# Altium footprint library 00.PcbLib: 150 footprints (part 3 of 10)
Each footprint in its own frame and in the unit in brackets; x right, y up, seen from the top. Pads: shape width x height; smd on the part's side, far side on the other; paste and mask are expansions set on the pad; w line width, h text height; cw(c..) or ccw(c..) is an arc to the next point about the centre after c.
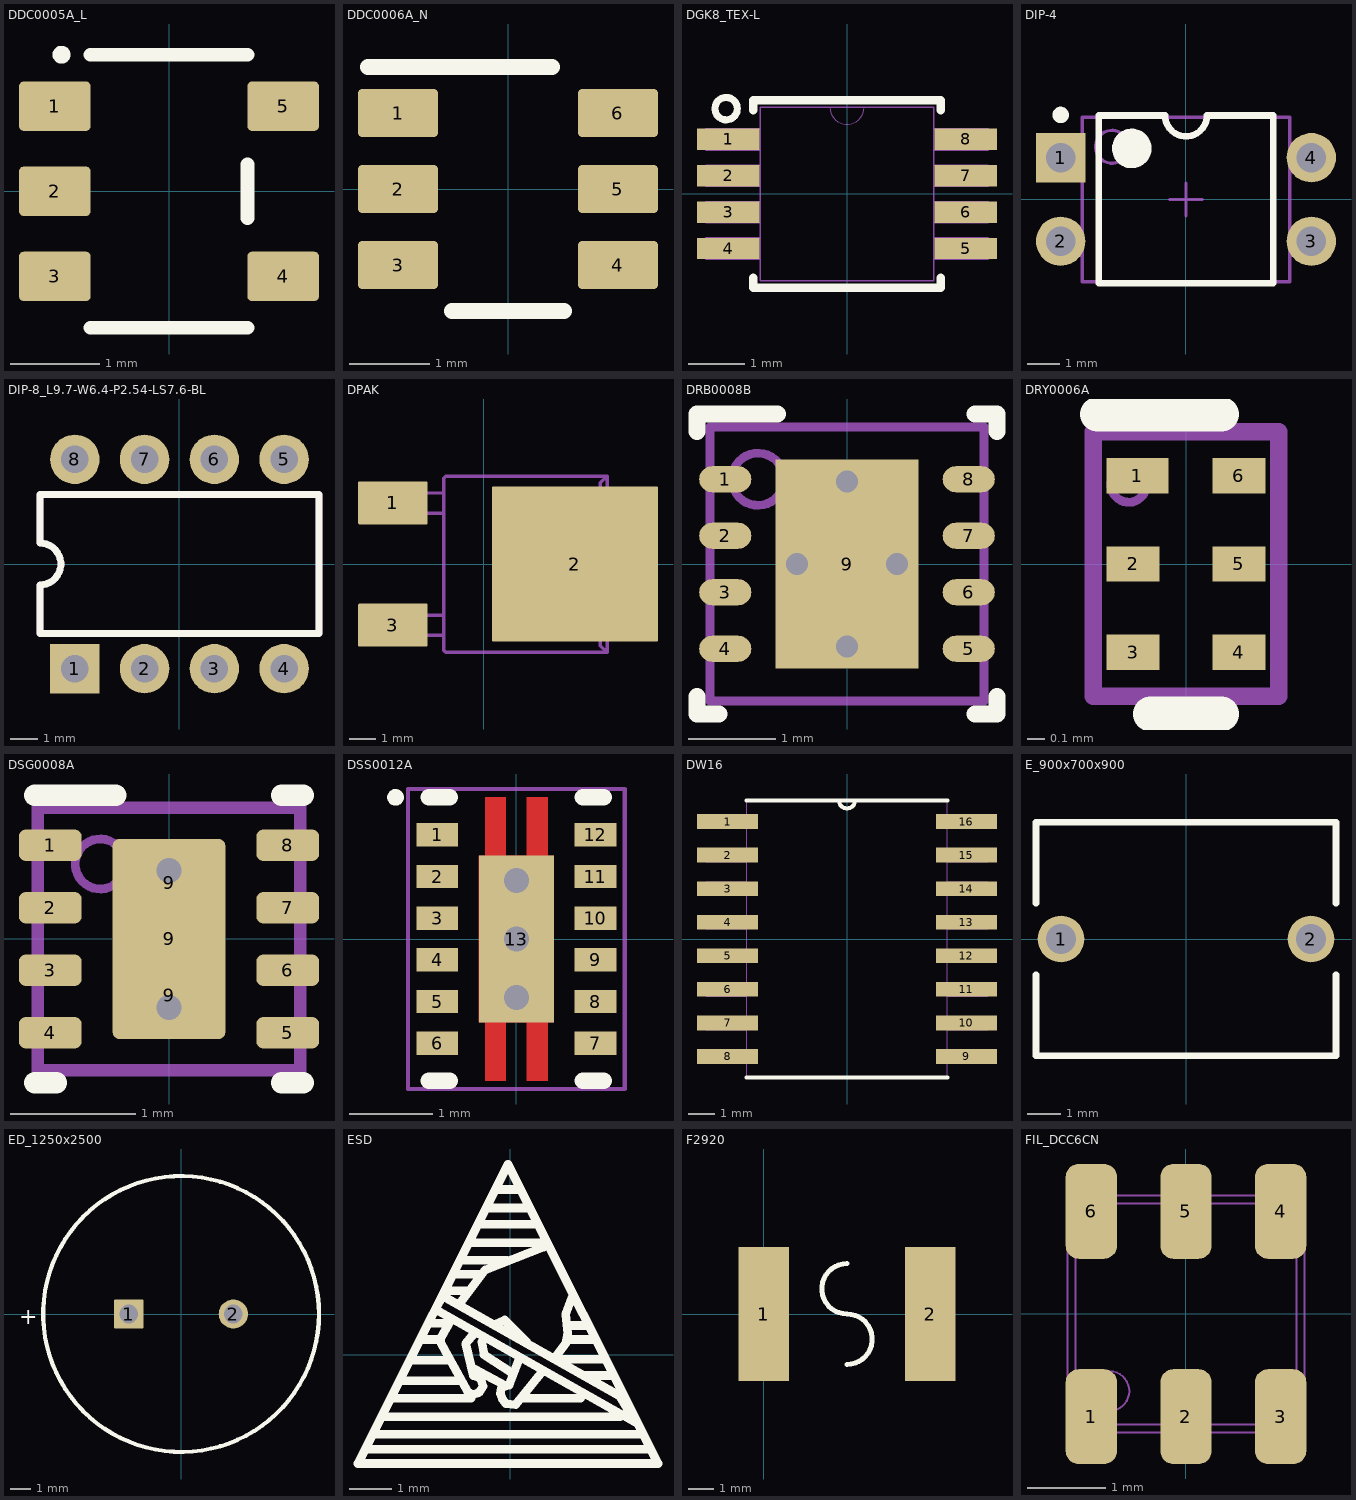
[diagram p2: the footprints below, top view; thin cyan lines are the x and y axes]

## DDC0005A_L [mm]
pads (5):
  rrect18% 0.8x0.55 smd: 1(-1.275,0.95) 2(-1.275,0) 3(-1.275,-0.95) 4(1.275,-0.95) 5(1.275,0.95)
Top Overlay:
  circle w0.1: c-1.2,1.525 r0.05
  lines w0.152: -0.876,-1.524 0.876,-1.524 ; -0.876,1.524 0.876,1.524 ; 0.876,-0.299 0.876,0.299
3D body "DDC0005A.stp": height 1.1, standoff 0, extent -1.405,-1.45 1.406,1.45

## DDC0006A_N [mm]
pads (6):
  rrect17% 1x0.6 smd: 1(-1.375,0.95) 2(-1.375,0) 3(-1.375,-0.95) 4(1.375,-0.95) 5(1.375,0) 6(1.375,0.95)
Top Overlay:
  lines w0.2: -1.75,1.525 0.55,1.525 ; -0.7,-1.524 0.7,-1.524
3D body "DDC0006A.stp": height 0.92, standoff 0, extent -1.434,-1.485 1.434,1.485

## DGK8_TEX-L [mil]
pads (8):
  rect 44x15 smd paste+0 mask+0: 1(-83.5,38.39) 2(-83.5,12.8) 3(-83.5,-12.8) 4(-83.5,-38.39) 5(83.5,-38.39) 6(83.5,-12.8) 7(83.5,12.8) 8(83.5,38.39)
Top Overlay:
  circle w5: c-85,60 r7.87
  lines w6: -66,-58.99 -66,-66 66,-66 66,-58.99 ; -66,58.99 -66,66 66,66 66,58.99
Top Component Outline (Mech100):
  lines w0: -12,61 ccw(c0,61) 12,61
  lines w1: -99.5,-45.89 -61,-45.89 -61,-30.89 -99.5,-30.89 -99.5,-45.89 ; -99.5,-20.3 -61,-20.3 -61,-5.3 -99.5,-5.3 -99.5,-20.3 ; -99.5,5.3 -61,5.3 -61,20.3 -99.5,20.3 -99.5,5.3 ; -99.5,30.89 -61,30.89 -61,45.89 -99.5,45.89 -99.5,30.89 ; -61,-61 61,-61 61,61 -61,61 -61,-61 ; 61,-45.89 99.5,-45.89 99.5,-30.89 61,-30.89 61,-45.89 ; 61,-20.3 99.5,-20.3 99.5,-5.3 61,-5.3 61,-20.3 ; 61,5.3 99.5,5.3 99.5,20.3 61,20.3 61,5.3 ; 61,30.89 99.5,30.89 99.5,45.89 61,45.89 61,30.89
3D body "DGK0008A.stp": height 43.31, standoff 0, extent -96.49,-58.99 96.5,59

## DIP-4 [mm] "DIP; 4 Leads; Row Spacing 7.62 mm; Pitch 2.54 mm"
height 5.6
pads (4):
  rect 1.5x1.5 hole 0.9: 1(-3.81,1.27)
  round 1.5 hole 0.9: 2(-3.81,-1.27) 3(3.81,-1.27) 4(3.81,1.27)
Top Overlay:
  circle w0.25: c-3.81,2.57 r0.125
  circle w0.6: c-1.65,1.55 r0.3
  lines w0.2: -0.635,2.55 ccw(c0,2.55) 0.635,2.55
  lines w0.203: -0.635,2.55 -2.65,2.55 -2.65,-2.55 2.65,-2.55 2.65,2.55 0.635,2.55
Top 3D Body:
  circle w0.1: c-2.25,1.6 r0.5
  lines w0.1: -3.15,-2.5 -3.15,2.5 3.15,2.5 3.15,-2.5 -3.15,-2.5
Mechanical 15:
  lines w0.1: -0.5,0 0.5,0 ; 0,-0.5 0,0.5
3D body: height 5.6, standoff 0, extent -3.15,-2.5 3.15,2.5

## DIP-8_L9.7-W6.4-P2.54-LS7.6-BL [mm]
pads (8):
  rect 1.8x1.8 hole 1: 1(-3.81,-3.81)
  round 1.8 hole 1: 2(-1.27,-3.81) 3(1.27,-3.81) 4(3.81,-3.81) 5(3.81,3.81) 6(1.27,3.81) 7(-1.27,3.81) 8(-3.81,3.81)
Top Overlay:
  lines w0.254: -5.08,-2.531 5.08,-2.531 5.08,2.534 -5.08,2.534 -5.08,0.762 cw(c-5.08,0) -5.08,-0.762 -5.08,-2.531
Top Component Outline (Mech100):
  lines w0.254: -5.08,-2.531 -5.08,-0.762 ccw(c-5.08,0) -5.08,0.762 -5.08,2.534 5.08,2.534 5.08,-2.531 -5.08,-2.531
3D body: height 4.5, standoff 0.5, extent -5.08,-2.54 5.08,2.54

## DPAK [mm]
pads (3):
  rrect6% 2.6x1.6 smd: 1(-3.4,2.28) 3(-3.4,-2.28)
  rrect2% 6.2x5.8 smd paste-3: 2(3.4,0)
Top Paste:
  rectangle: 0.4,-2.8 1.675,-1.625
  rectangle: 1.975,-2.8 3.25,-1.625
  rectangle: 3.55,-2.8 4.825,-1.625
  rectangle: 5.125,-2.8 6.4,-1.625
  rectangle: 5.125,-1.325 6.4,-0.15
  rectangle: 3.55,-1.325 4.825,-0.15
  rectangle: 1.975,-1.325 3.25,-0.15
  rectangle: 0.4,-1.325 1.675,-0.15
  rectangle: 5.125,0.15 6.4,1.325
  rectangle: 3.55,0.15 4.825,1.325
  rectangle: 1.975,0.15 3.25,1.325
  rectangle: 0.4,0.15 1.675,1.325
  rectangle: 5.125,1.625 6.4,2.8
  rectangle: 3.55,1.625 4.825,2.8
  rectangle: 1.975,1.625 3.25,2.8
  rectangle: 0.4,1.625 1.675,2.8
Top Component Outline (Mech100):
  lines w0.127: -1.5,-2.665 -3.899,-2.665 -3.899,-1.915 -1.5,-1.915 ; -1.5,1.9 -3.899,1.9 -3.899,2.65 -1.5,2.65 ; 4.6,-3.3 4.348,-3.048 4.348,3.028 4.6,3.28 ; 4.6,-3.3 4.6,-2.69 5.8,-2.69 5.8,-2.01 5.308,-2.01 5.308,1.99 5.8,1.99 5.8,2.67 4.6,2.67 4.6,3.28 ; 4.6,-3.3 -1.429,-3.3 -1.5,-3.229 -1.5,-3.157 -1.5,3.137 -1.5,3.209 -1.429,3.28 4.6,3.28
3D body "td03b.stp": height 2.48, standoff 0.01, extent -3.856,-3.29 5.843,3.29

## DRB0008B [mm]
pads (9):
  oval 0.6x0.3 smd paste+0 mask+0.051: 1(-1.4,0.975) 2(-1.4,0.325) 3(-1.4,-0.325) 4(-1.4,-0.975) 5(1.4,-0.975) 6(1.4,-0.325) 7(1.4,0.325) 8(1.4,0.975)
  rect 1.65x2.4 smd paste-1.187 mask+0.051: 9(0,0)
via 0.575,0 diameter 0.5 hole 0.254
via -0.575,0 diameter 0.5 hole 0.254
via 0,0.95 diameter 0.5 hole 0.254
via 0,-0.95 diameter 0.5 hole 0.254
Top Overlay:
  lines w0.2: -1.725,-1.525 -1.725,-1.725 -1.475,-1.725 ; -1.725,1.525 -1.725,1.725 -0.8,1.725 ; 1.475,-1.725 1.725,-1.725 1.725,-1.525 ; 1.475,1.725 1.725,1.725 1.725,1.525
Top Paste:
  region: -0.751,1.143 -0.751,0.1 0.752,0.1 0.752,1.143
  region: -0.751,-0.1 -0.751,-1.143 0.752,-1.143 0.752,-0.1
Top Component Outline (Mech100):
  circle w0.1: c-1.025,0.975 r0.3
  lines w0.1: -1.575,-1.575 1.575,-1.575 1.575,1.575 -1.575,1.575 -1.575,-1.575
3D body: height 0.25, standoff 0, extent -1.575,-1.575 1.575,1.575

## DRY0006A [mm]
pads (6):
  rect 0.35x0.2 smd: 1(-0.275,0.5)
  rect 0.3x0.2 smd: 2(-0.3,0) 3(-0.3,-0.5) 4(0.3,-0.5) 5(0.3,0) 6(0.3,0.5)
Top Overlay:
  lines w0.2: -0.5,0.85 0.2,0.85 ; -0.2,-0.85 0.2,-0.85
Top Courtyard:
  circle w0.05: c-0.325,0.45 r0.1
  lines w0.1: -0.525,-0.75 -0.525,0.75 0.525,0.75 0.525,-0.75 -0.525,-0.75
3D body: height 0.61, standoff 0.3, extent -0.424,0.351 -0.226,0.549
3D body: height 0.6, standoff 0, extent -0.525,-0.75 0.525,0.75

## DSG0008A [mm]
pads (11):
  rrect40% 0.5x0.25 smd: 1(-0.95,0.75) 2(-0.95,0.25) 3(-0.95,-0.25) 4(-0.95,-0.75) 5(0.95,-0.75) 6(0.95,-0.25) 7(0.95,0.25) 8(0.95,0.75)
  rrect50% 0.9x0.7 on Top Paste: 9(0,-0.45) 9(0,0.45)
  rrect11% 0.9x1.6 smd paste-0.45: 9(0,0)
via 0,0.55 diameter 0.5 hole 0.2
via 0,-0.55 diameter 0.5 hole 0.2
Top Overlay:
  lines w0.17: -1.075,-1.15 -0.9,-1.15 ; -1.075,1.15 -0.425,1.15 ; 0.9,-1.15 1.075,-1.15 ; 0.9,1.15 1.075,1.15
Top Component Outline (Mech100):
  circle w0.07: c-0.55,0.6 r0.2
  lines w0.1: -1.05,-1.05 1.05,-1.05 1.05,1.05 -1.05,1.05 -1.05,-1.05
3D body "DSG0008A.stp": height 0.77, standoff 0, extent -1,-1 1,1

## DSS0012A [mm]
pads (13):
  rect 0.5x0.28 smd paste-0.14 mask+0.076: 1(-0.95,1.25) 2(-0.95,0.75) 3(-0.95,0.25) 4(-0.95,-0.25) 5(-0.95,-0.75) 6(-0.95,-1.25) 7(0.95,-1.25) 8(0.95,-0.75) 9(0.95,-0.25) 10(0.95,0.25) 11(0.95,0.75) 12(0.95,1.25)
  rect 0.9x2 smd paste-0.45 mask+0.076: 13(0,0)
via 0,0 diameter 0.5 hole 0.3
via 0,0.7 diameter 0.5 hole 0.3
via 0,-0.7 diameter 0.5 hole 0.3
Top Layer:
  region: -0.125,-1.7 -0.375,-1.7 -0.375,-1 -0.45,-1 -0.45,1 -0.375,1 -0.375,1.7 -0.125,1.7 -0.125,1 0.125,1 0.125,1.7 0.375,1.7 0.375,1 0.45,1 0.45,-1 0.375,-1 0.375,-1.7 0.125,-1.7 0.125,-1 -0.125,-1
Top Overlay:
  circle w0.1: c-1.45,1.7 r0.05
  lines w0.2: -1.05,-1.7 -0.8,-1.7 ; -1.05,1.7 -0.8,1.7 ; 0.8,-1.7 1.05,-1.7 ; 0.8,1.7 1.05,1.7
Top Paste:
  region: -1.2,0.375 -1.2,0.125 -0.7,0.125 -0.7,0.375
  region: -0.375,1.7 -0.375,1.1 -0.125,1.1 -0.125,1.7
  region: -0.35,0.8 -0.35,-0.8 0.35,-0.8 0.35,0.8
  region: 0.375,1.1 0.375,1.7 0.125,1.7 0.125,1.1
  region: 0.375,-1.7 0.375,-1.1 0.125,-1.1 0.125,-1.7
  region: -0.375,-1.1 -0.375,-1.7 -0.125,-1.7 -0.125,-1.1
  region: -1.2,0.875 -1.2,0.625 -0.7,0.625 -0.7,0.875
  region: -1.2,1.375 -1.2,1.125 -0.7,1.125 -0.7,1.375
  region: -1.2,-0.125 -1.2,-0.375 -0.7,-0.375 -0.7,-0.125
  region: -1.2,-0.625 -1.2,-0.875 -0.7,-0.875 -0.7,-0.625
  region: -1.2,-1.125 -1.2,-1.375 -0.7,-1.375 -0.7,-1.125
  region: 0.7,-1.125 0.7,-1.375 1.2,-1.375 1.2,-1.125
  region: 0.7,-0.625 0.7,-0.875 1.2,-0.875 1.2,-0.625
  region: 0.7,-0.125 0.7,-0.375 1.2,-0.375 1.2,-0.125
  region: 0.7,0.375 0.7,0.125 1.2,0.125 1.2,0.375
  region: 0.7,0.875 0.7,0.625 1.2,0.625 1.2,0.875
  region: 0.7,1.375 0.7,1.125 1.2,1.125 1.2,1.375
Top Component Outline (Mech100):
  lines w0.05: -1.3,-1.8 1.3,-1.8 1.3,1.8 -1.3,1.8 -1.3,-1.8
3D body "DSS0012A.stp": height 0.8, standoff 0, extent -1,-1.5 1,1.5

## DW16 [mil]
pads (16):
  rect 91x22 smd: 1(-178,175) 2(-178,125) 3(-178,75) 4(-178,25) 5(-178,-25) 6(-178,-75) 7(-178,-125) 8(-178,-175) 9(178,-175) 10(178,-125) 11(178,-75) 12(178,-25) 13(178,25) 14(178,75) 15(178,125) 16(178,175)
Top Overlay:
  lines w6: -149.5,-206.5 149.5,-206.5 ; -149.5,206.5 149.5,206.5 ; -12,206.5 ccw(c0,206.5) 12,206.5
Top Component Outline (Mech100):
  lines w0: -12,206.5 ccw(c0,206.5) 12,206.5
  lines w1: -209.5,-185 -209.5,-165 -149.5,-165 -149.5,-185 -209.5,-185 ; -209.5,-135 -209.5,-115 -149.5,-115 -149.5,-135 -209.5,-135 ; -209.5,-85 -209.5,-65 -149.5,-65 -149.5,-85 -209.5,-85 ; -209.5,-35 -209.5,-15 -149.5,-15 -149.5,-35 -209.5,-35 ; -209.5,15 -209.5,35 -149.5,35 -149.5,15 -209.5,15 ; -209.5,65 -209.5,85 -149.5,85 -149.5,65 -209.5,65 ; -209.5,115 -209.5,135 -149.5,135 -149.5,115 -209.5,115 ; -209.5,165 -209.5,185 -149.5,185 -149.5,165 -209.5,165 ; -149.5,-206.5 149.5,-206.5 149.5,206.5 -149.5,206.5 -149.5,-206.5 ; 149.5,-185 149.5,-165 209.5,-165 209.5,-185 149.5,-185 ; 149.5,-135 149.5,-115 209.5,-115 209.5,-135 149.5,-135 ; 149.5,-85 149.5,-65 209.5,-65 209.5,-85 149.5,-85 ; 149.5,-35 149.5,-15 209.5,-15 209.5,-35 149.5,-35 ; 149.5,15 149.5,35 209.5,35 209.5,15 149.5,15 ; 149.5,65 149.5,85 209.5,85 209.5,65 149.5,65 ; 149.5,115 149.5,135 209.5,135 209.5,115 149.5,115 ; 149.5,165 149.5,185 209.5,185 209.5,165 149.5,165
3D body "DW0016B.stp": height 101.81, standoff 0, extent -203.44,-202.75 203.45,202.76

## E_900x700x900 [mm]
pads (2):
  round 1.4 hole 0.9: 1(-3.75,0) 2(3.75,0)
Top Overlay:
  lines w0.2: -4.5,-1.071 -4.5,-3.5 4.5,-3.5 4.5,-1.071 ; -4.5,1.071 -4.5,3.5 4.5,3.5 4.5,1.071
3D body: height 0.3, standoff -2.5, extent -4.047,-0.299 -3.45,0.3
3D body: height 1.36, standoff -0.16, extent -4.047,-1.732 -3.45,0.3
3D body: height 6.12, standoff 0.81, extent -4.047,-1.732 -1.545,-1.033
3D body: height 6.12, standoff 0.81, extent 1.546,1.033 4.048,1.732
3D body: height 1.36, standoff -0.16, extent 3.45,-0.299 4.048,1.732
3D body: height 0.3, standoff -2.5, extent 3.45,-0.299 4.048,0.299
3D body: height 11.96, standoff 3, extent -4.491,-3.5 4.491,3.5

## ED_1250x2500 [mm]
pads (2):
  rrect7% 1.4x1.4 hole 0.9: 1(-2.5,0)
  round 1.4 hole 0.9: 2(2.5,0)
Top Overlay:
  circle w0.2: c0,0 r6.6
  text "+" at -7.755,-0.5 h0.76
3D body "ED_1250x2500.stp": height 27.01, standoff -4, extent -6.5,-6.498 6.51,6.498

## ESD [mm]
Top Overlay:
  lines w0.203: -3.354,-2.214 3.225,-2.214 ; -3.151,-1.859 3.047,-1.859 ; -2.922,-1.452 2.564,-1.452 ; -2.719,-1.02 -0.915,-1.02 ; -2.541,-0.614 -1.169,-0.614 ; -2.262,-0.131 -1.449,-0.131 ; -2.008,0.351 -1.677,0.351 ; -1.83,0.732 -1.55,0.732 ; -1.627,0.377 -1.373,0.834 ; -1.627,0.402 -1.627,0.275 -0.992,-0.868 -0.89,-0.944 -0.738,-0.893 -0.636,-0.741 -0.687,-0.563 -0.865,-0.487 -1.042,0.25 -0.839,0.504 ; -1.449,1.494 -1.017,1.494 ; -1.296,1.875 -0.712,1.875 ; -1.144,1.24 -0.585,1.977 0.786,2.51 ; -1.093,2.205 -0.077,2.205 ; -0.941,2.612 0.736,2.612 ; -0.839,-0.335 -0.128,-0.716 ; -0.687,3.044 0.558,3.044 ; -0.661,0.3 -0.611,-0.004 0.05,-0.436 ; -0.509,3.425 0.38,3.425 ; -0.357,0.707 -0.128,0.808 0.38,0.3 ; -0.306,3.856 0.177,3.856 ; 0.202,-0.106 -0.026,-0.716 -0.128,-0.741 -0.204,-0.792 -0.23,-0.919 -0.179,-1.046 -0.103,-1.147 0.126,-1.173 0.761,-0.385 ; 0.329,-1.02 1.65,-1.02 ; 1.04,-0.081 1.294,0.25 1.345,0.504 1.294,0.935 1.447,1.342 ; 1.193,-0.106 2.133,-0.106 ; 1.371,0.351 1.955,0.351 ; 1.447,0.681 1.752,0.681 ; 1.777,-0.487 2.336,-0.487 ; -3.557,-2.544 3.453,-2.544 -0.052,4.441 -3.557,-2.544 ; -1.754,1.062 2.92,-1.579 2.564,-0.97 -1.576,1.367 -1.754,1.062

## F2920 [mm]
pads (2):
  rect 2x5.3 smd: 1(0,0) 2(6.6,0)
Top Overlay:
  lines w0.2: 3.3,-2 ccw(c3.3,-1) 3.3,0 cw(c3.3,1) 3.3,2
3D body "pfsm-030-2.stp": height 2.16, standoff -1.01, extent -0.186,-2.72 7.169,2.72

## FIL_DCC6CN [mm] "FIL_DCC6CN"
pads (6):
  rrect50% 0.65x1.202 smd: 1(-1.2,-1.3) 2(0,-1.3) 3(1.2,-1.3) 4(1.2,1.3) 5(0,1.3) 6(-1.2,1.3)
Top Component Outline (Mech100):
  circle w0.025: c-0.97,-0.977 r0.251
  lines w0.025: -1.5,-1.5 -1.5,1.5 1.5,1.5 1.5,-1.5 -1.5,-1.5 ; -1.4,-1.15 ccw(c-1.15,-1.15) -1.15,-1.4 1.15,-1.4 ccw(c1.15,-1.15) 1.4,-1.15 1.4,1.15 ccw(c1.15,1.15) 1.15,1.4 -1.15,1.4 ccw(c-1.15,1.15) -1.4,1.15 -1.4,-1.15
3D body: height 3.81, standoff 0, extent -1.5,-1.5 1.5,1.5